# Altium schematic symbol library relay.SCHLIB: 425 symbols (part 1 of 3) (continued)
## DS2E-L-* (continued)
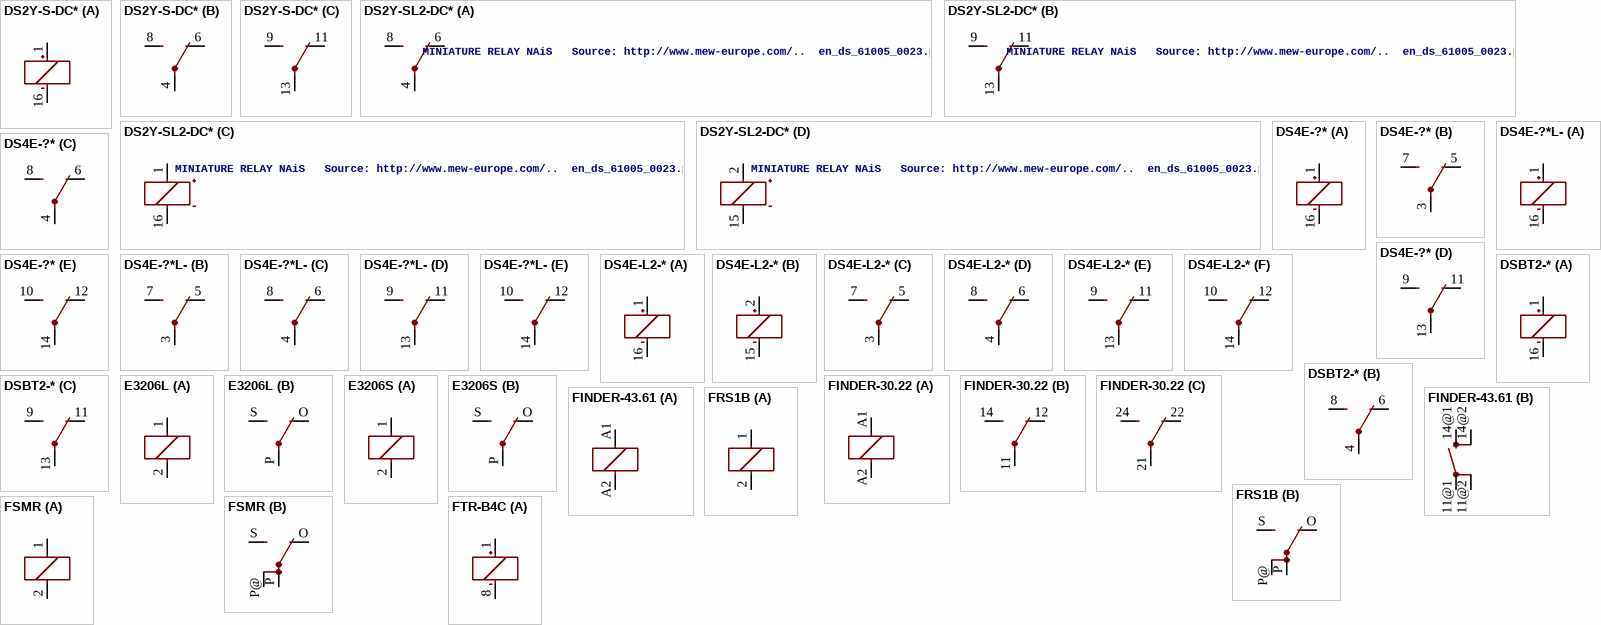
[diagram p5: symbols DS2Y-S-DC* to FTR-B4C]

## DS2Y-S-DC*
designator K?, comment MINIATURE RELAY NAiS   Source: http://www.mew-europe.com/..  en_ds_61005_0023.pdf  (value not drawn)
MPN: DS2Y-S-DC1.5V; MPN: DS2Y-S-DC12V; MPN: DS2Y-S-DC24V; MPN: DS2Y-S-DC3V; MPN: DS2Y-S-DC48V; MPN: DS2Y-S-DC5V; MPN: DS2Y-S-DC6V; MPN: DS2Y-S-DC9V; OC_FARNELL: unknown; OC_NEWARK: 10C5827; OC_NEWARK: 13P3261; OC_NEWARK: 13P3264; OC_NEWARK: 10C5832; OC_NEWARK: 13P3267; OC_NEWARK: 13P3268; OC_NEWARK: 13P3271; OC_NEWARK: 13P3272
footprint DS2Y
part A pins: 1 +, 16 -
part B pins: 4 P, 6 O, 8 S
part C pins: 9 S, 11 O, 13 P

## DS2Y-SL2-DC*
designator K?, comment MINIATURE RELAY NAiS   Source: http://www.mew-europe.com/..  en_ds_61005_0023.pdf
MPN: DS2Y-SL2-DC1.5V; MPN: DS2Y-SL2-DC12V; MPN: DS2Y-SL2-DC24V; MPN: DS2Y-SL2-DC3V; MPN: DS2Y-SL2-DC48V; MPN: DS2Y-SL2-DC5V; MPN: DS2Y-SL2-DC6V; MPN: DS2Y-SL2-DC9V; MF: AROMAT/ MATSUSHITA; OC_FARNELL: unknown; OC_NEWARK: 10C5841; OC_NEWARK: 52F9208; OC_FARNELL: 1372981; OC_NEWARK: 64K3125; OC_NEWARK: 91B6712; OC_NEWARK: 10C5844; OC_NEWARK: 93F4484; OC_NEWARK: 99F8886; OC_NEWARK: 10C5848
footprint DS2Y-2
part A pins: 4 P, 6 O, 8 S
part B pins: 9 S, 11 O, 13 P
part C pins: 1 +, 16 -
part D pins: 2 +, 15 -

## DS4E-?*
designator K?, comment DS-RELAYS HIGHLY SENSITIVE 1500 V FCC SURGE NAiS    WITHSTANDING MINIATURE RELAY Source: http://www.mew-europe.com/..  en_ds_61005_0001.pdf  (value not drawn)
OC_FARNELL: unknown; OC_NEWARK: unknown
footprint DS4E
part A pins: 1 +, 16 -
part B pins: 3 P, 5 O, 7 S
part C pins: 4 P, 6 O, 8 S
part D pins: 9 S, 11 O, 13 P
part E pins: 10 S, 12 O, 14 P

## DS4E-?*L-
designator K?, comment DS-RELAYS HIGHLY SENSITIVE 1500 V FCC SURGE NAiS    WITHSTANDING MINIATURE RELAY Source: http://www.mew-europe.com/..  en_ds_61005_0001.pdf  (value not drawn)
OC_FARNELL: unknown; OC_NEWARK: unknown
footprint DS4E
part A pins: 1 +, 16 -
part B pins: 3 P, 5 O, 7 S
part C pins: 4 P, 6 O, 8 S
part D pins: 9 S, 11 O, 13 P
part E pins: 10 S, 12 O, 14 P

## DS4E-L2-*
designator K?, comment DS-RELAYS HIGHLY SENSITIVE 1500 V FCC SURGE NAiS    WITHSTANDING MINIATURE RELAY Source: http://www.mew-europe.com/..  en_ds_61005_0001.pdf  (value not drawn)
OC_FARNELL: unknown; OC_NEWARK: unknown
footprint DS4E-L
part A pins: 1 +, 16 -
part B pins: 2 +, 15 -
part C pins: 3 P, 5 O, 7 S
part D pins: 4 P, 6 O, 8 S
part E pins: 9 S, 11 O, 13 P
part F pins: 10 S, 12 O, 14 P

## DSBT2-*
designator K?, comment DS-BT RELAYS 4,000 V BREAKDOWN VOLTAGE NAiS   Source: http://www.mew-europe.com/..  en_ds_61005_0010.pdf  (value not drawn)
MPN: DSBT2-S-DC3V; OC_FARNELL: unknown; OC_NEWARK: unknown; OC_NEWARK: 11N4489
footprint DS-BT
part A pins: 1 +, 16 -
part B pins: 4 P, 6 O, 8 S
part C pins: 9 S, 11 O, 13 P

## E3206L
designator K?, comment RELAY   1 x switch, Eichhoff/distributor Schukat  (value not drawn)
OC_FARNELL: unknown; OC_NEWARK: unknown
footprint E3206L
part A pins: 1, 2
part B pins: O, P, S

## E3206S
designator K?, comment RELAY   1 x switch, Eichhoff/distributor Schukat  (value not drawn)
OC_FARNELL: unknown; OC_NEWARK: unknown
footprint E3206S
part A pins: 1, 2
part B pins: O, P, S

## FINDER-30.22
designator K?, comment SUBMINIATURE DIL-RELAIS FINDER 30.22.9.024.0000   Kontakt max. AC - 125V Distributor: Farnell Bestell Nr.: 1217371 Source: http://www.farnell.com/datasheets/87634.pdf  (value not drawn)
OC_FARNELL: unknown; OC_NEWARK: unknown
footprint FINDER-30.22
part A pins: A1 1, A2 2
part B pins: 11 P, 12 O, 14 S
part C pins: 21 P, 22 O, 24 S

## FINDER-43.61
designator K?, comment Low profile PCB relays 10 - 16 A FINDER 43 Series   Kontakt max. AC- 250V,  Strom - Kontakt  AC- max. 10A 5 mm contact pin pitch,  1 Pole NO, 16 A, PCB mount Distributor: FARNELL Source: http://www.farnell.com/datasheets/87682.pdf  (value not drawn)
OC_FARNELL: unknown; OC_NEWARK: unknown
footprint FINDER-43.61
part A pins: A1 1, A2 2
part B pins: 11@1 PA, 11@2 PB, 14@1 SA, 14@2 SB

## FRS1B
designator K?, comment RELAY   1 x switch, same as V23101-D6-A201, Siemens  (value not drawn)
OC_FARNELL: unknown; OC_NEWARK: unknown
footprint FRS1B
part A pins: 1, 2
part B pins: O, P, P@ P@1, S

## FSMR
designator K?, comment RELAY   1 x switch, same as FBR21D/H, Fujitsu  (value not drawn)
OC_FARNELL: unknown; OC_NEWARK: unknown
footprint FSMR
part A pins: 1, 2
part B pins: O, P, P@ P@1, S

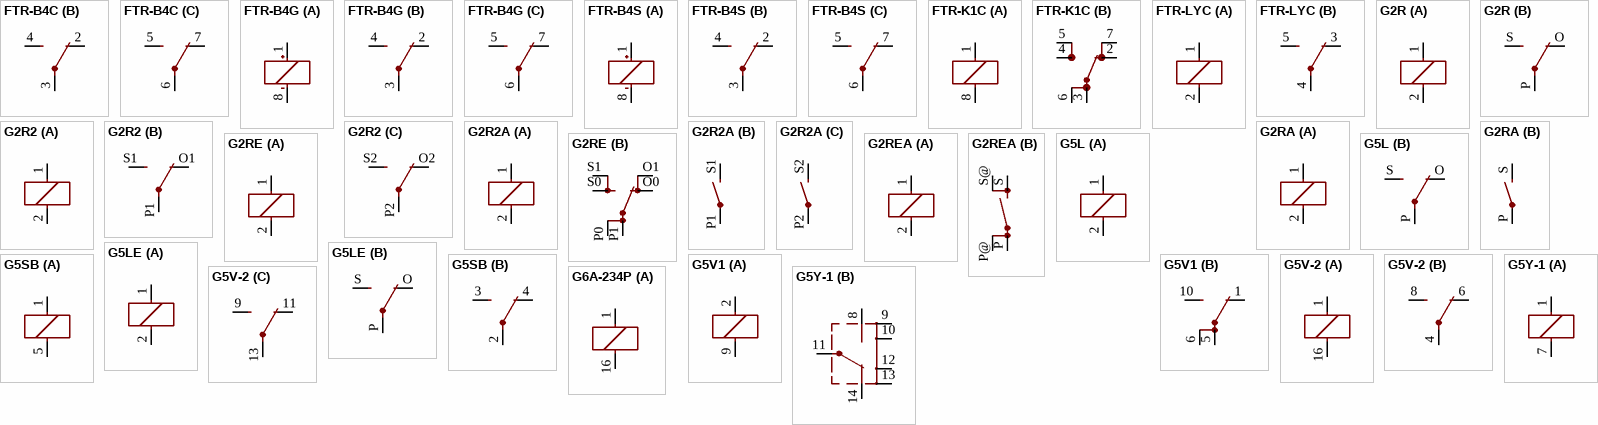
[diagram p6: symbols FTR-B4C to G6A-234P]

## FTR-B4C
designator K?, comment ULTRA MINIATURE RELAY 2 POLES - 2 A (Slim Profile Signal Relay)   FUJITSU FTR-B4 SERIES Source: FTR-B4.pdf  (value not drawn)
footprint FTR-B4C
part A pins: 1 +, 8 -
part B pins: 2 O, 3 P, 4 S
part C pins: 5 S, 6 P, 7 O

## FTR-B4G
designator K?, comment ULTRA MINIATURE RELAY 2 POLES - 2 A (Slim Profile Signal Relay)   FUJITSU FTR-B4 SERIES Source: FTR-B4.pdf  (value not drawn)
footprint FTR-B4G
part A pins: 1 +, 8 -
part B pins: 2 O, 3 P, 4 S
part C pins: 5 S, 6 P, 7 O

## FTR-B4S
designator K?, comment ULTRA MINIATURE RELAY 2 POLES - 2 A (Slim Profile Signal Relay)   FUJITSU FTR-B4 SERIES Source: FTR-B4.pdf  (value not drawn)
footprint FTR-B4S
part A pins: 1 +, 8 -
part B pins: 2 O, 3 P, 4 S
part C pins: 5 S, 6 P, 7 O

## FTR-K1C
designator K?, comment NETZRELAIS FTR-K1CK024W1XUM 16A/250VAC 1 Umschaltkontakt   Distributor: Conrad Electronic Bestell Nr.: 504389-13 - 24V Source: http://www.produktinfo.conrad.com/datenblaetter/500000-524999/504384-da-01-de-NETZRELAIS_FTR_K1CK012W1XUM_16A_250VAC.pdf  (value not drawn)
OC_FARNELL: unknown; OC_NEWARK: unknown
footprint FTR-K1C
part A pins: 1, 8 2
part B pins: 2 OA, 3 PA, 4 SA, 5 SB, 6 PB, 7 OB

## FTR-LYC
designator K?, comment Schmales Netzrelais   NETZRELAIS FTR-LYCA024V 1XUM 6A/250VAC Distributor: Conrad electronic Bestell Nr.: 504382 - 62  Source: http://www2.produktinfo.conrad.com/datenblaetter/500000-524999/504382-da-01-de-NETZRELAIS_FTR-LYCA024V_1XUM_6A_250VAC.pdf  (value not drawn)
OC_FARNELL: unknown; OC_NEWARK: unknown
footprint FTR-LYC
part A pins: 1, 2
part B pins: 3 O, 4 P, 5 S

## G2R
designator K?, comment RELAY   1 x switch, Omron  (value not drawn)
OC_FARNELL: 1569185; OC_NEWARK: unknown
footprint G2R
part A pins: 1, 2
part B pins: O, P, S

## G2R2
designator K?, comment RELAY   2 x switch, Omron  (value not drawn)
MPN: G2R-2-DC6; MF: OMRON COMPONENTS USA; OC_FARNELL: unknown; OC_NEWARK: 89C5317
footprint G2R2
part A pins: 1, 2
part B pins: O1 O, P1 P, S1 S
part C pins: O2 O, P2 P, S2 S

## G2R2A
designator K?, comment RELAY   2 x norm. open, Omron  (value not drawn)
MPN: G2R-2A-DC24; OC_FARNELL: 6985269; OC_NEWARK: 36M5257
footprint G2R2A
part A pins: 1, 2
part B pins: P1 P, S1 S
part C pins: P2 P, S2 S

## G2RA
designator K?, comment RELAY   1 x norm. open, Omron  (value not drawn)
OC_FARNELL: unknown; OC_NEWARK: unknown
footprint G2RA
part A pins: 1, 2
part B pins: P, S

## G2RE
designator K?, comment RELAY   1 x switch, high current, Omron  (value not drawn)
OC_FARNELL: unknown; OC_NEWARK: unknown
footprint G2RE
part A pins: 1, 2
part B pins: O0 O, O1 O@1, P0 P@1, P1 P, S0 S, S1 S@1

## G2REA
designator K?, comment RELAY   1 x norm. open, high current, Omron  (value not drawn)
OC_FARNELL: unknown; OC_NEWARK: unknown
footprint G2REA
part A pins: 1, 2
part B pins: P, P@ P@1, S, S@ S@1

## G5L
designator K?, comment RELAY   1 x switch, 10 A/120 V AC, 8 A/30 V ADC, Omron  (value not drawn)
OC_FARNELL: unknown; OC_NEWARK: unknown
footprint G5LE
part A pins: 1, 2
part B pins: O, P, S

## G5LE
designator K?, comment RELAY   1 x switch, 10 A/120 V AC, 8 A/30 V DC, Omron  (value not drawn)
OC_FARNELL: unknown; OC_NEWARK: unknown
footprint G5LE
part A pins: 1, 2
part B pins: O, P, S

## G5SB
designator K?, comment Compact Single-pole Relay for Switching 5 A   Source: http://www.omron.com/ecb/products/pry/121/g5sb.html  (value not drawn)
OC_FARNELL: unknown; OC_NEWARK: unknown
footprint G5SB
part A pins: 1, 5 2
part B pins: 2 P, 3 S, 4 O

## G5V1
designator K?, comment RELAY   1 x switch, 0.5 A/125 V AC, 1 A/24 V DC , Omron  (value not drawn)
MPN: G5V-1-DC24; OC_FARNELL: 9949593; OC_NEWARK: 36M6377
footprint G5V1
part A pins: 2 1, 9 2
part B pins: 1 O, 5 P, 6 P@1, 10 S

## G5V-2
designator K?, comment OMRON PCB Relay   Source: http://www.omron.com/ecb/products/pdf/en-g5v2.pdf  (value not drawn)
MPN: G5V-2 5DC; OC_FARNELL: 9949488; OC_NEWARK: 78K5703
footprint G5V-2
part A pins: 1, 16 2
part B pins: 4 P, 6 O, 8 S
part C pins: 9 S, 11 O, 13 P

## G5Y-1
designator K?, comment RELAY   RF Relay up to 900 MHz, 1 x switch, 10 W, Omron  (value not drawn)
OC_FARNELL: unknown; OC_NEWARK: unknown
footprint G5Y-1
part A pins: 1, 7 2
part B pins: 8 S, 9 ES@1, 10 ES@2, 11 P, 12 ES@3, 13 ES@4, 14 O

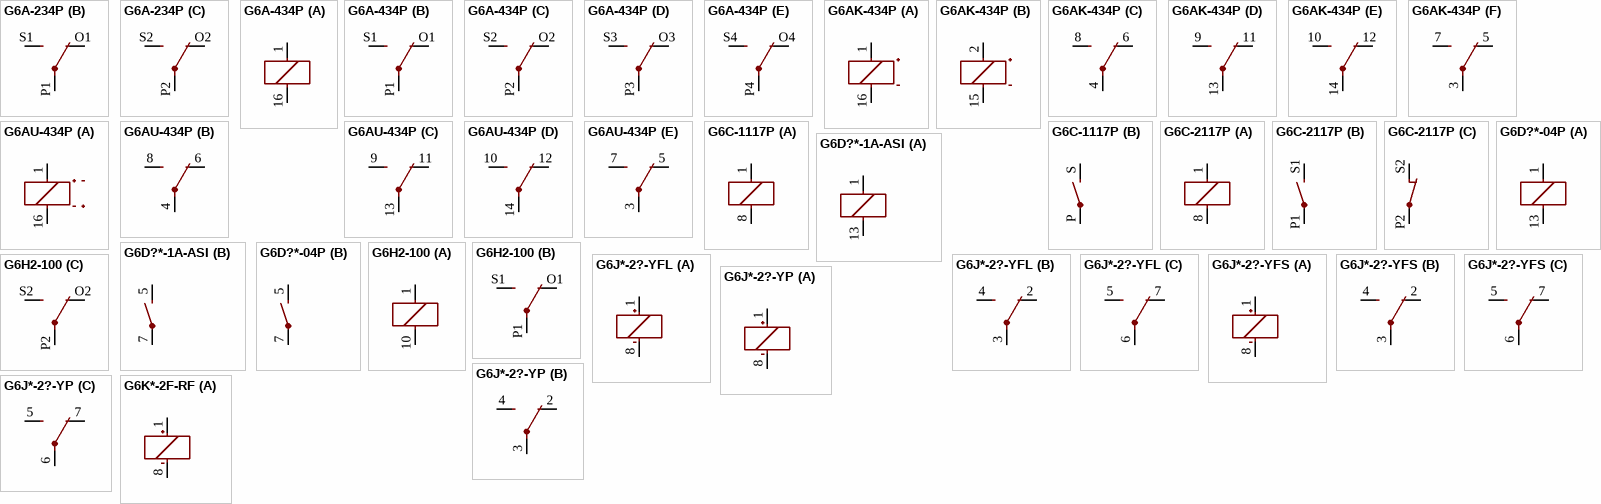
[diagram p7: symbols G6A-234P to G6K*-2F-RF]

## G6A-234P
designator K?, comment RELAY   2 x switch, 0.3 A/125 V AC, 1 A/30 V DC, Omron  (value not drawn)
OC_FARNELL: unknown; OC_NEWARK: unknown
footprint G6A-234P
part A pins: 1, 16 2
part B pins: O1 O, P1 P, S1 S
part C pins: O2 O, P2 P, S2 S

## G6A-434P
designator K?, comment RELAY   4 x switch, 0.3 A/125 V AC, 1 A/30 V DC, Omron  (value not drawn)
OC_FARNELL: unknown; OC_NEWARK: unknown
footprint G6A-434P
part A pins: 1, 16 2
part B pins: O1 O, P1 P, S1 S
part C pins: O2 O, P2 P, S2 S
part D pins: O3 O, P3 P, S3 S
part E pins: O4 O, P4 P, S4 S

## G6AK-434P
designator K?, comment RELAY   4 x switch, dual coil latching, 0.3 A/125 V AC, 1 A/30 V DC, Omron  (value not drawn)
OC_FARNELL: unknown; OC_NEWARK: unknown
footprint G6AK-434P
part A pins: 1 +, 16 -
part B pins: 2 +, 15 -
part C pins: 4 P, 6 O, 8 S
part D pins: 9 S, 11 O, 13 P
part E pins: 10 S, 12 O, 14 P
part F pins: 3 P, 5 O, 7 S

## G6AU-434P
designator K?, comment RELAY   4 x switch, single coil latching, 0.3 A/125 V AC, 1 A/30 V DC, Omron  (value not drawn)
OC_FARNELL: unknown; OC_NEWARK: unknown
footprint G6AU-434P
part A pins: 1 +, 16 -
part B pins: 4 P, 6 O, 8 S
part C pins: 9 S, 11 O, 13 P
part D pins: 10 S, 12 O, 14 P
part E pins: 3 P, 5 O, 7 S

## G6C-1117P
designator K?, comment RELAY   1 x norm. open, 10 A/240 V, Omron  (value not drawn)
OC_FARNELL: unknown; OC_NEWARK: unknown
footprint G6C-1117P
part A pins: 1, 8 2
part B pins: P, S

## G6C-2117P
designator K?, comment RELAY   1 x norm. open, 1x norm. closed, 10 A/240 V, Omron  (value not drawn)
OC_FARNELL: unknown; OC_NEWARK: unknown
footprint G6C-2117P
part A pins: 1, 8 2
part B pins: P1 P, S1 S
part C pins: P2 P, S2 O

## G6D?*-1A-ASI
designator K?, comment OMRON Slim, Miniature PCB Relay 17.5 Ã— 6.5 Ã— 12.5 mm   with Socked Source: http://ecb.omron.com.sg/pdf/relay/power/G6D.pdf  (value not drawn)
OC_FARNELL: unknown; OC_NEWARK: unknown; OC_FARNELL: 9812660
footprint G6D
part A pins: 1, 13 2
part B pins: 5 S, 7 P

## G6D?*-04P
designator K?, comment OMRON Slim, Miniature PCB Relay 17.5 Ã— 6.5 Ã— 12.5 mm   with Socked Source: http://ecb.omron.com.sg/pdf/relay/power/G6D.pdf  (value not drawn)
OC_FARNELL: unknown; OC_NEWARK: unknown
footprint G6D-SOCKET
part A pins: 1, 13 2
part B pins: 5 S, 7 P

## G6H2-100
designator K?, comment RELAY   2 x switch, 0.5 A/125 V AC, 1 A/30 V DC, Omron  (value not drawn)
OC_FARNELL: unknown; OC_NEWARK: unknown
footprint G6H2-100
part A pins: 1, 10 2
part B pins: O1 O, P1 P, S1 S
part C pins: O2 O, P2 P, S2 S

## G6J*-2?-YFL
designator K?, comment Surface-Mounting Signal Relay - G6J-Y 5.7 x 10.6 x 9 mm   Source: http://www.omroncomponents.eu/ .. K125-E2-02-X.pdf  (value not drawn)
MPN: G6J-2FL-Y-TR DC4.5; MPN: G6JU-2FL-Y DC3; OC_FARNELL: 1798618; OC_NEWARK: 04M9907; OC_FARNELL: unknown; OC_NEWARK: 04M9916
footprint G6J-2FL-Y
part A pins: 1 +, 8 -
part B pins: 2 O, 3 P, 4 S
part C pins: 5 S, 6 P, 7 O

## G6J*-2?-YFS
designator K?, comment Surface-Mounting Signal Relay - G6J-Y 5.7 x 10.6 x 9 mm   Source: http://www.omroncomponents.eu/ .. K125-E2-02-X.pdf  (value not drawn)
MPN: G6J-2FS-Y DC4.5; OC_FARNELL: unknown; OC_NEWARK: 04M9910; OC_NEWARK: unknown
footprint G6J-2FS-Y
part A pins: 1 +, 8 -
part B pins: 2 O, 3 P, 4 S
part C pins: 5 S, 6 P, 7 O

## G6J*-2?-YP
designator K?, comment Surface-Mounting Signal Relay - G6J-Y 5.7 x 10.6 x 9 mm   Source: http://www.omroncomponents.eu/ .. K125-E2-02-X.pdf  (value not drawn)
MPN: G6J-2P-Y-DC12; MPN: G6JU-2P-Y-DC12; MF: OMRON COMPONENTS USA; OC_FARNELL: unknown; OC_NEWARK: 70J9830; OC_NEWARK: 70J9842
footprint G6J-2P-Y
part A pins: 1 +, 8 -
part B pins: 2 O, 3 P, 4 S
part C pins: 5 S, 6 P, 7 O

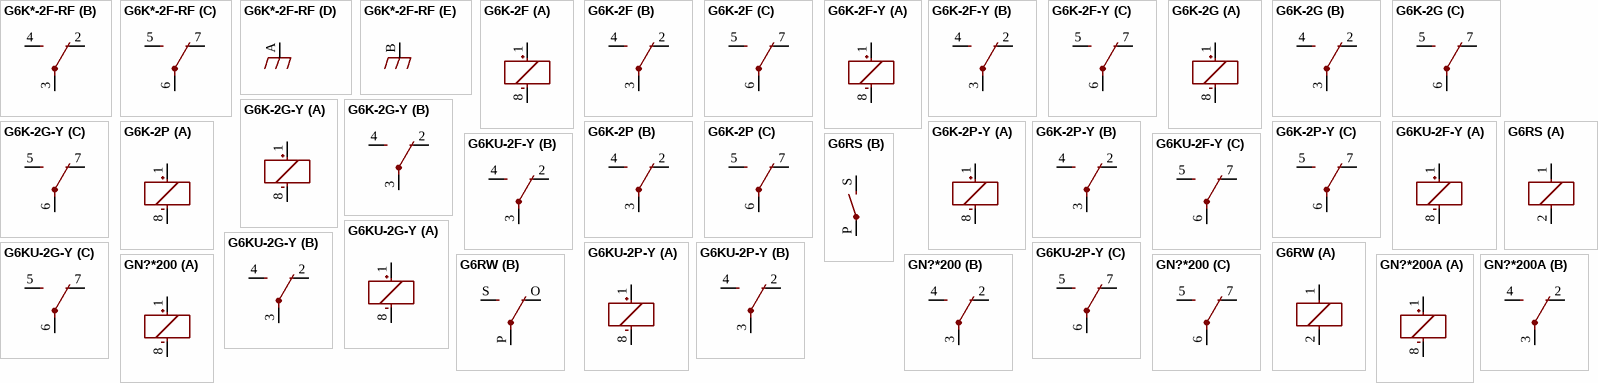
[diagram p8: symbols G6K*-2F-RF to GN?*200A]

## G6K*-2F-RF
designator K?, comment OMRON High Frequency Relay G6K-RF   Compact High Frequency Relays with 2 Form C (DPDT) Contacts Handles 1 A, 30 VDC discrete load and 1 W at 1 GHz high frequency load D20G6KRF0602.pdf  (value not drawn)
MPN: G6K-2F-RF-DC12; MF: OMRON COMPONENTS USA; OC_FARNELL: 1448181; OC_NEWARK: 73C8948; OC_FARNELL: unknown; OC_NEWARK: unknown
footprint G6K-RF
part A pins: 1 +, 8 -
part B pins: 2 O, 3 P, 4 S
part C pins: 5 S, 6 P, 7 O
part D pins: A SH
part E pins: B SH

## G6K-2F
designator K?, comment Low Signal Relay   oeiwcsnts1.omron.com/.. D20G6K0100.pdf  (value not drawn)
MPN: G6K-2F DC24; MF: OMRON COMPONENTS USA; OC_FARNELL: 1690427; OC_NEWARK: 36K7467
footprint G6K-2F
part A pins: 1 +, 8 -
part B pins: 2 O, 3 P, 4 S
part C pins: 5 S, 6 P, 7 O

## G6K-2F-Y
designator K?, comment Low Signal Relay   oeiwcsnts1.omron.com/.. D20G6K0100.pdf  (value not drawn)
MPN: G6K-2F-Y DC3; MF: OMRON COMPONENTS USA; OC_FARNELL: 1690316; OC_NEWARK: 89C6451
footprint G6K-2F-Y
part A pins: 1 +, 8 -
part B pins: 2 O, 3 P, 4 S
part C pins: 5 S, 6 P, 7 O

## G6K-2G
designator K?, comment Low Signal Relay   oeiwcsnts1.omron.com/.. D20G6K0100.pdf  (value not drawn)
MPN: G6K-2G DC12; MF: OMRON COMPONENTS USA; OC_FARNELL: 4601695; OC_NEWARK: 93B9118
footprint G6K-2G
part A pins: 1 +, 8 -
part B pins: 2 O, 3 P, 4 S
part C pins: 5 S, 6 P, 7 O

## G6K-2G-Y
designator K?, comment Low Signal Relay   oeiwcsnts1.omron.com/.. D20G6K0100.pdf  (value not drawn)
OC_FARNELL: 4484794; OC_NEWARK: unknown
footprint G6K-2G-Y
part A pins: 1 +, 8 -
part B pins: 2 O, 3 P, 4 S
part C pins: 5 S, 6 P, 7 O

## G6K-2P
designator K?, comment Low Signal Relay   oeiwcsnts1.omron.com/.. D20G6K0100.pdf  (value not drawn)
MPN: G6K-2P DC3; MF: OMRON COMPONENTS USA; OC_FARNELL: 3937276; OC_NEWARK: 89C6482
footprint G6K-2P
part A pins: 1 +, 8 -
part B pins: 2 O, 3 P, 4 S
part C pins: 5 S, 6 P, 7 O

## G6K-2P-Y
designator K?, comment Low Signal Relay   oeiwcsnts1.omron.com/.. D20G6K0100.pdf  (value not drawn)
MPN: G6K-2P-Y DC12; MF: OMRON COMPONENTS USA; OC_FARNELL: 3937276; OC_NEWARK: 34C3464
footprint G6K-2P-Y
part A pins: 1 +, 8 -
part B pins: 2 O, 3 P, 4 S
part C pins: 5 S, 6 P, 7 O

## G6KU-2F-Y
designator K?, comment Low Signal Relay   oeiwcsnts1.omron.com/.. D20G6K0100.pdf  (value not drawn)
MPN: G6KU-2F-Y DC3; MF: OMRON COMPONENTS USA; OC_FARNELL: unknown; OC_NEWARK: 89C6496
footprint G6KU-2F-Y
part A pins: 1 +, 8 -
part B pins: 2 O, 3 P, 4 S
part C pins: 5 S, 6 P, 7 O

## G6KU-2G-Y
designator K?, comment Low Signal Relay   oeiwcsnts1.omron.com/.. D20G6K0100.pdf  (value not drawn)
MPN: G6KU-2G-Y DC5; MF: OMRON COMPONENTS USA; OC_FARNELL: 1690320; OC_NEWARK: 89C6505
footprint G6KU-2G-Y
part A pins: 1 +, 8 -
part B pins: 2 O, 3 P, 4 S
part C pins: 5 S, 6 P, 7 O

## G6KU-2P-Y
designator K?, comment Low Signal Relay   oeiwcsnts1.omron.com/.. D20G6K0100.pdf  (value not drawn)
MPN: G6KU-2P-Y DC5; MF: OMRON COMPONENTS USA; OC_FARNELL: unknown; OC_NEWARK: 35K4536
footprint G6KU-2P-Y
part A pins: 1 +, 8 -
part B pins: 2 O, 3 P, 4 S
part C pins: 5 S, 6 P, 7 O

## G6RS
designator K?, comment RELAY   1 x norm. open, Omron  (value not drawn)
OC_FARNELL: unknown; OC_NEWARK: unknown
footprint G6RS
part A pins: 1, 2
part B pins: P, S

## G6RW
designator K?, comment RELAY   1 x switch, Omron  (value not drawn)
OC_FARNELL: unknown; OC_NEWARK: unknown
footprint G6RW
part A pins: 1, 2
part B pins: O, P, S

## GN?*200
designator K?, comment ULTRA-SMALL PACKAGE SLIM POLARIZED RELAY NAiS   Source: http://www.mew-europe.com/..  en_ds_61007_0000.pdf  (value not drawn)
MPN: AGN20003; MPN: AGN20006; MPN: AGN20009; MPN: AGN20012; MPN: AGN2001H; MPN: AGN20024; MPN: AGN2004H; MF: AROMAT/ MATSUSHITA; OC_FARNELL: unknown; OC_NEWARK: 13P0830; OC_NEWARK: 13P0831; OC_NEWARK: 10C3280; OC_FARNELL: 3104783; OC_NEWARK: 13P0832; OC_NEWARK: 10C3281; OC_FARNELL: 4364211; OC_NEWARK: 13P0833; OC_FARNELL: 3104771; OC_NEWARK: 13P0834
footprint GN
part A pins: 1 +, 8 -
part B pins: 2 O, 3 P, 4 S
part C pins: 5 S, 6 P, 7 O

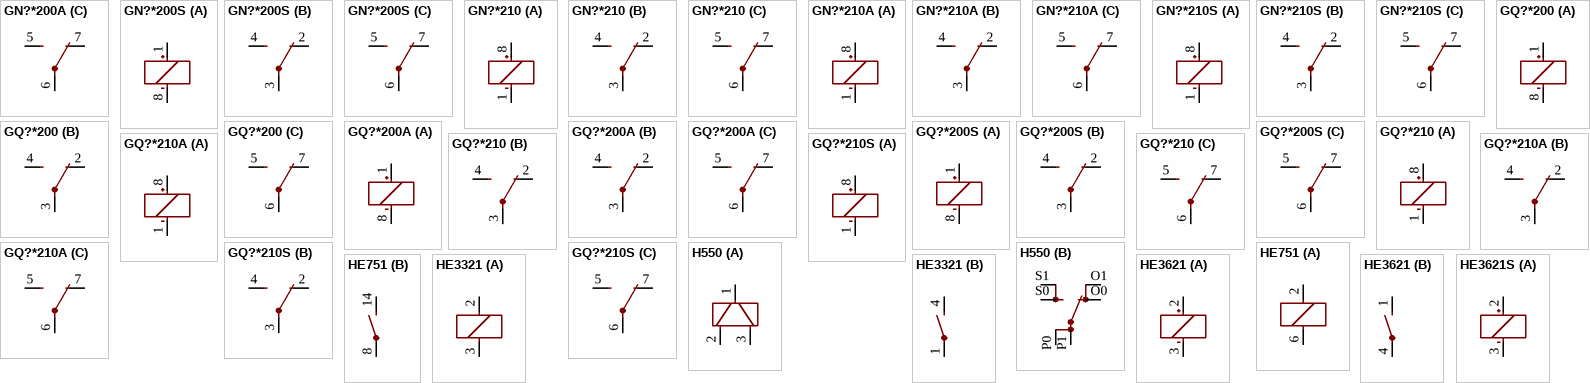
[diagram p9: symbols GN?*200A to HE3621S]

## GN?*200A
designator K?, comment ULTRA-SMALL PACKAGE SLIM POLARIZED RELAY NAiS   Source: http://www.mew-europe.com/..  en_ds_61007_0000.pdf  (value not drawn)
MPN: AGN200A03; MPN: AGN200A06; MPN: AGN200A09Z; MPN: AGN200A12; MPN: AGN200A24; MPN: AGN200A4H; OC_FARNELL: unknown; OC_NEWARK: 13P0812; OC_NEWARK: 13P0814; OC_NEWARK: 13P0815; OC_FARNELL: 3104801; OC_NEWARK: 13P0816; OC_NEWARK: unknown; OC_NEWARK: 13P0818; OC_FARNELL: 3104795; OC_NEWARK: 13P0820
footprint GN-A
part A pins: 1 +, 8 -
part B pins: 2 O, 3 P, 4 S
part C pins: 5 S, 6 P, 7 O

## GN?*200S
designator K?, comment ULTRA-SMALL PACKAGE SLIM POLARIZED RELAY NAiS   Source: http://www.mew-europe.com/..  en_ds_61007_0000.pdf  (value not drawn)
MPN: AGN200S03; MPN: AGN200S12; MPN: AGN200S24; MPN: AGN200S4H; OC_FARNELL: unknown; OC_NEWARK: 13P0822; OC_NEWARK: unknown; OC_FARNELL: 1448335; OC_NEWARK: 13P0824; OC_NEWARK: 13P0826; OC_NEWARK: 13P0828
footprint GN-S
part A pins: 1 +, 8 -
part B pins: 2 O, 3 P, 4 S
part C pins: 5 S, 6 P, 7 O

## GN?*210
designator K?, comment ULTRA-SMALL PACKAGE SLIM POLARIZED RELAY NAiS   Source: http://www.mew-europe.com/..  en_ds_61007_0000.pdf  (value not drawn)
MPN: AGN21003; MPN: AGN21006; MPN: AGN21012; MPN: AGN2104H; OC_FARNELL: unknown; OC_NEWARK: 15P8576; OC_NEWARK: 15P8577; OC_NEWARK: unknown; OC_NEWARK: 15P8578; OC_NEWARK: 15P8579
footprint GN
part A pins: 1 -, 8 +
part B pins: 2 O, 3 P, 4 S
part C pins: 5 S, 6 P, 7 O
